# Altium footprint library SparkFun-Retired.PCBLIB: 303 footprints (part 19 of 19)
Each footprint in its own frame and in the unit in brackets; x right, y up, seen from the top. Pads: shape width x height; smd on the part's side, far side on the other; paste and mask are expansions set on the pad; w line width, h text height; cw(c..) or ccw(c..) is an arc to the next point about the centre after c.
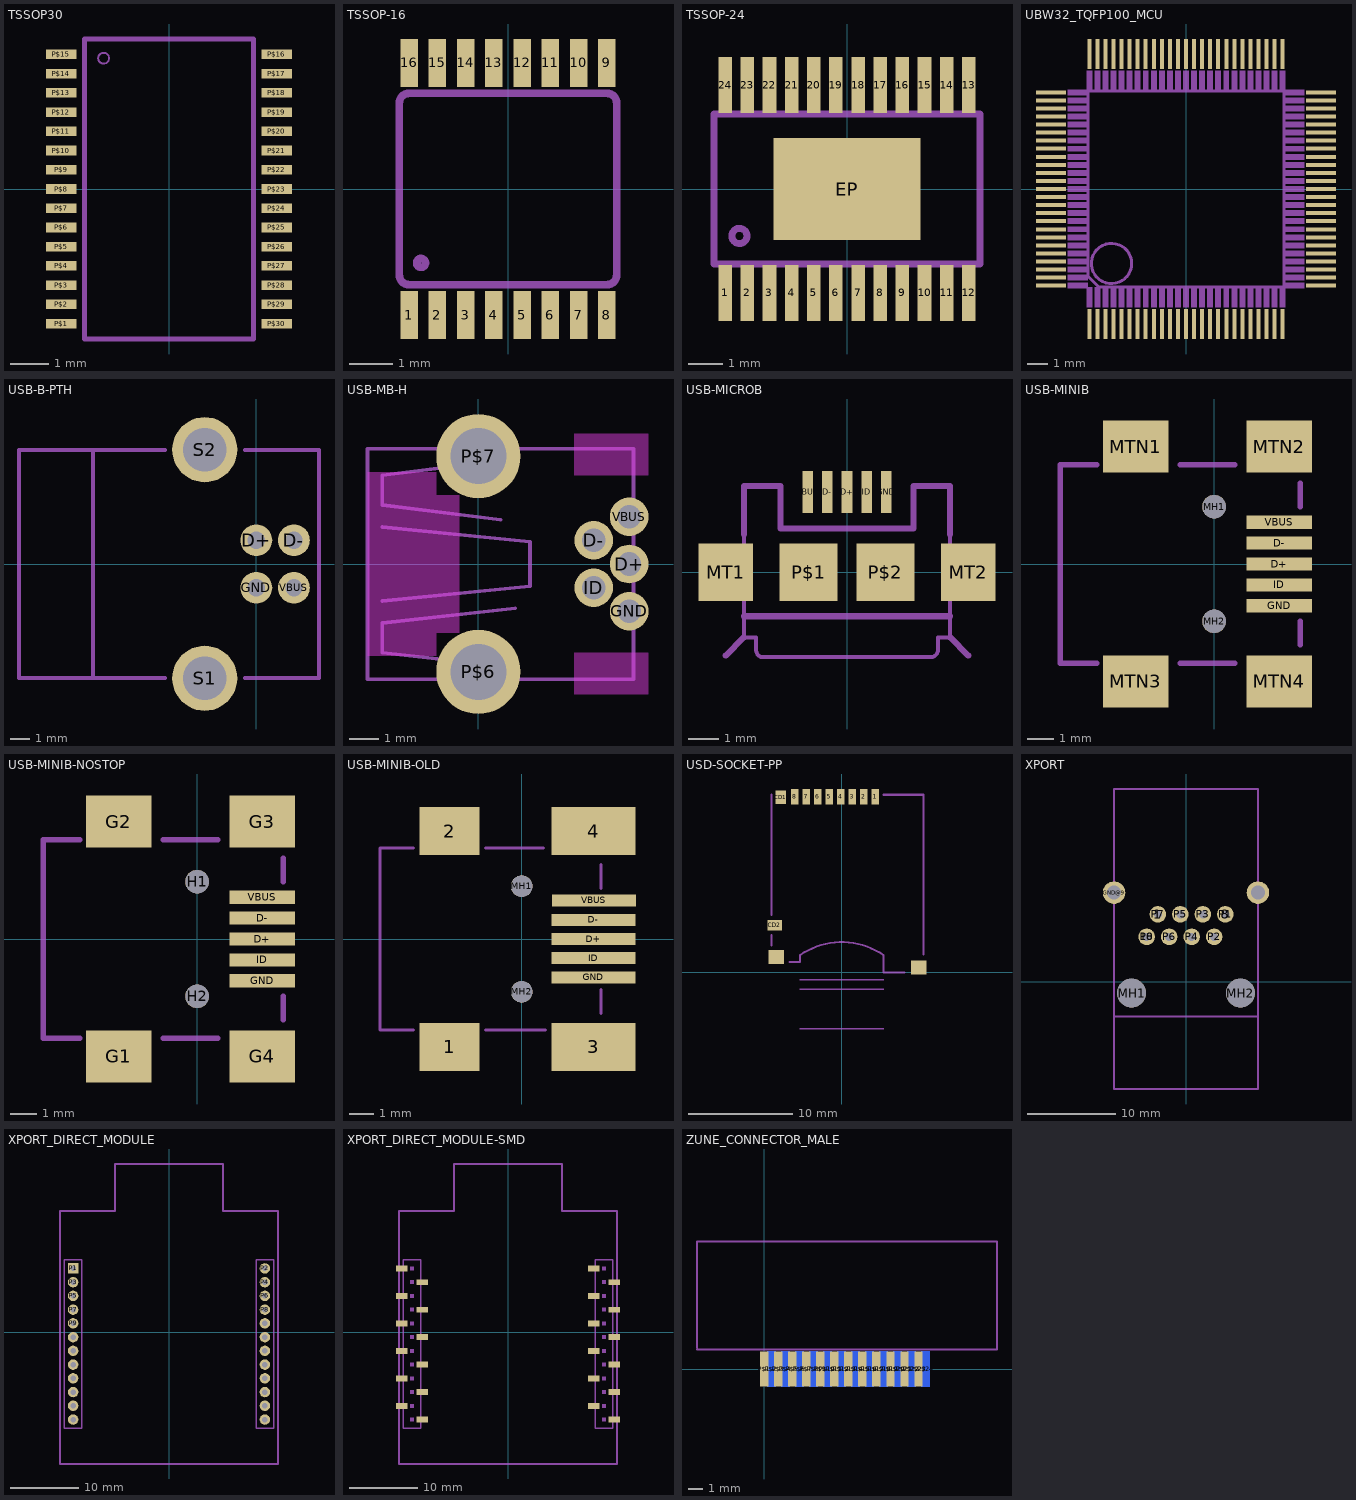
[diagram p18: the footprints below, top view; thin cyan lines are the x and y axes]

## TSSOP30 [mil]
pads (30):
  rect 31.5x9.84 smd: P$1(-110.24,-137.8) P$2(-110.24,-118.11) P$3(-110.24,-98.43) P$4(-110.24,-78.74) P$5(-110.24,-59.06) P$6(-110.24,-39.37) P$7(-110.24,-19.69) P$8(-110.24,0) P$9(-110.24,19.69) P$10(-110.24,39.37) P$11(-110.24,59.06) P$12(-110.24,78.74) P$13(-110.24,98.43) P$14(-110.24,118.11) P$15(-110.24,137.8) P$16(110.24,137.8) P$17(110.24,118.11) P$18(110.24,98.43) P$19(110.24,78.74) P$20(110.24,59.06) P$21(110.24,39.37) P$22(110.24,19.69) P$23(110.24,0) P$24(110.24,-19.69) P$25(110.24,-39.37) P$26(110.24,-59.06) P$27(110.24,-78.74) P$28(110.24,-98.43) P$29(110.24,-118.11) P$30(110.24,-137.8)
tDocu:
  lines w5: -86.61,-153.54 86.61,-153.54 86.61,153.54 -86.61,153.54 -86.61,-153.54
tPlace:
  circle w1.97: c-66.93,133.86 r5.57
  lines w5: -86.61,-153.54 86.61,-153.54 86.61,153.54 -86.61,153.54 -86.61,-153.54

## TSSOP-16 [mil]
pads (16):
  rect 15.75x43.31 smd: 1(-89.57,-114.17) 2(-63.98,-114.17) 3(-38.39,-114.17) 4(-12.8,-114.17) 5(12.8,-114.17) 6(38.39,-114.17) 7(63.98,-114.17) 8(89.57,-114.17) 9(89.57,114.17) 10(63.98,114.17) 11(38.39,114.17) 12(12.8,114.17) 13(-12.8,114.17) 14(-38.39,114.17) 15(-63.98,114.17) 16(-89.57,114.17)
tDocu:
  region: 6.89,-125.98 6.89,-102.36 18.7,-102.36 18.7,-125.98
  region: -18.7,-125.98 -18.7,-102.36 -6.89,-102.36 -6.89,-125.98
  region: -44.29,-125.98 -44.29,-102.36 -32.48,-102.36 -32.48,-125.98
  region: -69.88,-125.98 -69.88,-102.36 -58.07,-102.36 -58.07,-125.98
  region: 32.48,-125.98 32.48,-102.36 44.29,-102.36 44.29,-125.98
  region: 58.07,-125.98 58.07,-102.36 69.88,-102.36 69.88,-125.98
  region: 83.66,-125.98 83.66,-102.36 95.47,-102.36 95.47,-125.98
  region: -95.47,-125.98 -95.47,-102.36 -83.66,-102.36 -83.66,-125.98
  region: -6.89,125.98 -6.89,102.36 -18.7,102.36 -18.7,125.98
  region: 18.7,125.98 18.7,102.36 6.89,102.36 6.89,125.98
  region: 44.29,125.98 44.29,102.36 32.48,102.36 32.48,125.98
  region: 69.88,125.98 69.88,102.36 58.07,102.36 58.07,125.98
  region: -32.48,125.98 -32.48,102.36 -44.29,102.36 -44.29,125.98
  region: -58.07,125.98 -58.07,102.36 -69.88,102.36 -69.88,125.98
  region: -83.66,125.98 -83.66,102.36 -95.47,102.36 -95.47,125.98
  region: 95.47,125.98 95.47,102.36 83.66,102.36 83.66,125.98
tPlace:
  circle w7: c-78.74,-66.93 r3.94
  lines w7: -98.43,-77.81 ccw(c-89.62,-77.81) -89.62,-86.61 89.62,-86.61 ccw(c89.62,-77.81) 98.43,-77.81 98.43,77.81 ccw(c89.62,77.81) 89.62,86.61 -89.62,86.61 ccw(c-89.62,77.81) -98.43,77.81 -98.43,-77.81

## TSSOP-24 [mm]
pads (25):
  rect 0.4x1.65 smd: 1(-3.575,-3.05) 2(-2.925,-3.05) 3(-2.275,-3.05) 4(-1.625,-3.05) 5(-0.975,-3.05) 6(-0.325,-3.05) 7(0.325,-3.05) 8(0.975,-3.05) 9(1.625,-3.05) 10(2.275,-3.05) 11(2.925,-3.05) 12(3.575,-3.05) 13(3.575,3.05) 14(2.925,3.05) 15(2.275,3.05) 16(1.625,3.05) 17(0.975,3.05) 18(0.325,3.05) 19(-0.325,3.05) 20(-0.975,3.05) 21(-1.625,3.05) 22(-2.275,3.05) 23(-2.925,3.05) 24(-3.575,3.05)
  rect 4.32x3 smd: EP(0,0)
tDocu:
  region: 0.2,-3.2 0.2,-2.2 0.45,-2.2 0.45,-3.2
  region: 0.85,-3.2 0.85,-2.2 1.1,-2.2 1.1,-3.2
  region: 1.5,-3.2 1.5,-2.2 1.75,-2.2 1.75,-3.2
  region: 2.15,-3.2 2.15,-2.2 2.4,-2.2 2.4,-3.2
  region: 2.8,-3.2 2.8,-2.2 3.05,-2.2 3.05,-3.2
  region: 3.45,-3.2 3.45,-2.2 3.7,-2.2 3.7,-3.2
  region: -0.45,-3.2 -0.45,-2.2 -0.2,-2.2 -0.2,-3.2
  region: -1.1,-3.2 -1.1,-2.2 -0.85,-2.2 -0.85,-3.2
  region: -1.75,-3.2 -1.75,-2.2 -1.5,-2.2 -1.5,-3.2
  region: -2.4,-3.2 -2.4,-2.2 -2.15,-2.2 -2.15,-3.2
  region: -3.05,-3.2 -3.05,-2.2 -2.8,-2.2 -2.8,-3.2
  region: -3.7,-3.2 -3.7,-2.2 -3.45,-2.2 -3.45,-3.2
  region: 0.2,2.2 0.2,3.2 0.45,3.2 0.45,2.2
  region: 0.85,2.2 0.85,3.2 1.1,3.2 1.1,2.2
  region: 1.5,2.2 1.5,3.2 1.75,3.2 1.75,2.2
  region: 2.15,2.2 2.15,3.2 2.4,3.2 2.4,2.2
  region: 2.8,2.2 2.8,3.2 3.05,3.2 3.05,2.2
  region: 3.45,2.2 3.45,3.2 3.7,3.2 3.7,2.2
  region: -0.45,2.2 -0.45,3.2 -0.2,3.2 -0.2,2.2
  region: -1.1,2.2 -1.1,3.2 -0.85,3.2 -0.85,2.2
  region: -1.75,2.2 -1.75,3.2 -1.5,3.2 -1.5,2.2
  region: -2.4,2.2 -2.4,3.2 -2.15,3.2 -2.15,2.2
  region: -3.05,2.2 -3.05,3.2 -2.8,3.2 -2.8,2.2
  region: -3.7,2.2 -3.7,3.2 -3.45,3.2 -3.45,2.2
  lines w0.203: -3.9,-2.2 3.9,-2.2 3.9,2.2 -3.9,2.2 -3.9,-2.2
tPlace:
  circle w0.203: c-3.156,-1.378 r0.223
  lines w0.203: -3.9,-2 -3.9,2 ; 3.9,-2 3.9,2

## UBW32_TQFP100_MCU [mm]
pads (100):
  rect 0.2x1.5 smd paste+0: 1(-4.8,-6.7) 2(-4.4,-6.7) 3(-4,-6.7) 4(-3.6,-6.7) 5(-3.2,-6.7) 6(-2.8,-6.7) 7(-2.4,-6.7) 8(-2,-6.7) 9(-1.6,-6.7) 10(-1.2,-6.7) 11(-0.8,-6.7) 12(-0.4,-6.7) 13(0,-6.7) 14(0.4,-6.7) 15(0.8,-6.7) 16(1.2,-6.7) 17(1.6,-6.7) 18(2,-6.7) 19(2.4,-6.7) 20(2.8,-6.7) 21(3.2,-6.7) 22(3.6,-6.7) 23(4,-6.7) 24(4.4,-6.7) 25(4.8,-6.7) 51(4.8,6.7) 52(4.4,6.7) 53(4,6.7) 54(3.6,6.7) 55(3.2,6.7) 56(2.8,6.7) 57(2.4,6.7) 58(2,6.7) 59(1.6,6.7) 60(1.2,6.7) 61(0.8,6.7) 62(0.4,6.7) 63(0,6.7) 64(-0.4,6.7) 65(-0.8,6.7) 66(-1.2,6.7) 67(-1.6,6.7) 68(-2,6.7) 69(-2.4,6.7) 70(-2.8,6.7) 71(-3.2,6.7) 72(-3.6,6.7) 73(-4,6.7) 74(-4.4,6.7) 75(-4.8,6.7)
  rect 1.5x0.2 smd paste+0: 26(6.7,-4.8) 27(6.7,-4.4) 28(6.7,-4) 29(6.7,-3.6) 30(6.7,-3.2) 31(6.7,-2.8) 32(6.7,-2.4) 33(6.7,-2) 34(6.7,-1.6) 35(6.7,-1.2) 36(6.7,-0.8) 37(6.7,-0.4) 38(6.7,0) 39(6.7,0.4) 40(6.7,0.8) 41(6.7,1.2) 42(6.7,1.6) 43(6.7,2) 44(6.7,2.4) 45(6.7,2.8) 46(6.7,3.2) 47(6.7,3.6) 48(6.7,4) 49(6.7,4.4) 50(6.7,4.8) 76(-6.7,4.8) 77(-6.7,4.4) 78(-6.7,4) 79(-6.7,3.6) 80(-6.7,3.2) 81(-6.7,2.8) 82(-6.7,2.4) 83(-6.7,2) 84(-6.7,1.6) 85(-6.7,1.2) 86(-6.7,0.8) 87(-6.7,0.4) 88(-6.7,0) 89(-6.7,-0.4) 90(-6.7,-0.8) 91(-6.7,-1.2) 92(-6.7,-1.6) 93(-6.7,-2) 94(-6.7,-2.4) 95(-6.7,-2.8) 96(-6.7,-3.2) 97(-6.7,-3.6) 98(-6.7,-4) 99(-6.7,-4.4) 100(-6.7,-4.8)
Top Paste:
  drawing of 100 lines, arcs and shapes, not listed
tDocu:
  drawing of 100 lines, arcs and shapes, not listed
tPlace:
  circle w0.152: c-3.7,-3.7 r1
  lines w0.152: -4.873,-4.323 -4.323,-4.873 4.873,-4.873 4.873,4.873 -4.873,4.873 -4.873,-4.323

## USB-B-PTH [mil]
pads (6):
  round 66 hole 36: D+(0,49.21) D-(78,49.21) GND(0,-49.21) VBUS(78,-49.21)
  round 135 hole 90: S1(-107,-237) S2(-107,237)
tDocu:
  lines w8: -492.13,-236.22 -338.58,-236.22 -338.58,236.22 -492.13,236.22 -492.13,-236.22
tPlace:
  lines w8: -338.58,-236.22 -188.98,-236.22 ; -338.58,236.22 -188.98,236.22 ; -23.62,-236.22 129.92,-236.22 129.92,236.22 -23.62,236.22

## USB-MB-H [mil]
pads (7):
  round 51.5 hole 31.5: D+(200.79,0) D-(153.54,31.5) GND(200.79,-62.99) ID(153.54,-31.5) VBUS(200.79,62.99)
  round 112.2 hole 74.8: P$6(0,-143.7) P$7(0,143.7)
Top keep-out:
  region: 127.95,118.11 127.95,173.23 226.38,173.23 226.38,118.11
  region: 127.95,-173.23 127.95,-118.11 226.38,-118.11 226.38,-173.23
  region: -147.64,-122.05 -147.64,122.05 -56.1,122.05 -56.1,-122.05
  region: -56.1,-91.54 -56.1,91.54 -25.59,91.54 -25.59,-91.54
bPlace:
  lines w5: -127.95,-49.21 68.9,-29.53 68.9,29.53 -127.95,49.21 ; 29.53,59.06 -127.95,78.74 -127.95,118.11 29.53,137.8 ; 49.21,-137.8 -127.95,-118.11 -127.95,-78.74 49.21,-59.06 ; -147.64,-153.54 -147.64,153.54 206.69,153.54 206.69,-153.54 -147.64,-153.54

## USB-MICROB [mm]
pads (9):
  rect 0.35x1.4 smd: D+(0,2.65) D-(-0.65,2.65) GND(1.3,2.65) ID(0.65,2.65) VBUS(-1.3,2.65)
  rect 1.8x1.9 smd: MT1(-4,0) MT2(4,0)
  rect 1.9x1.9 smd: P$1(-1.27,0) P$2(1.27,0)
tDocu:
  lines w0.127: -3.4,-1.45 -3.4,-2.15 -3,-2.15 -3,-2.55 ccw(c-2.762,-2.565) -2.8,-2.8 2.75,-2.8 ccw(c2.765,-2.563) 3,-2.6 3,-2.15 3.4,-2.15 3.4,-1.45 ; -3.4,-1.45 -3.4,2.85 -2.2,2.85 -2.2,1.45 2.2,1.45 2.2,2.85 3.4,2.85 3.4,-1.45 ; -3.4,-1.45 3.4,-1.45
  lines w0.203: -4,-2.75 -3.4,-2.15 ; 3.4,-2.15 4,-2.75
tPlace:
  lines w0.203: -3.4,-1.45 3.4,-1.45 ; -3.4,1.25 -3.4,2.85 -2.2,2.85 -2.2,1.45 2.2,1.45 2.2,2.85 3.4,2.85 3.4,1.25

## USB-MINIB [mm]
pads (11):
  rect 2.5x0.5 smd: D+(2.5,0) D-(2.5,0.8) GND(2.5,-1.6) ID(2.5,-0.8) VBUS(2.5,1.6)
  round 0.9 hole 0.9 unplated: MH1(0,2.2) MH2(0,-2.2)
  rect 2.5x2 smd: MTN1(-3,4.5) MTN2(2.5,4.5) MTN3(-3,-4.5) MTN4(2.5,-4.5)
tDocu:
  lines w0.203: -4.5,-3.8 -5.9,-3.8 -5.9,3.8 -4.5,3.8
tPlace:
  lines w0.203: -1.3,-3.8 0.8,-3.8 ; -1.3,3.8 0.8,3.8 ; 3.3,-3.1 3.3,-2.2 ; 3.3,2.2 3.3,3.1

## USB-MINIB-NOSTOP [mm]
pads (11):
  rect 2.5x0.5 smd: D+(2.5,0) D-(2.5,0.8) GND(2.5,-1.6) ID(2.5,-0.8) VBUS(2.5,1.6)
  rect 2.5x2 smd: G1(-3,-4.5) G2(-3,4.5) G3(2.5,4.5) G4(2.5,-4.5)
  round 0.9 hole 0.9: H1(0,2.2) H2(0,-2.2)
Top Solder:
  circle w0.41: c0,2.2 r0.35
  circle w0.41: c0,-2.2 r0.35
tDocu:
  lines w0.203: -4.5,-3.8 -5.9,-3.8 -5.9,3.8 -4.5,3.8
tPlace:
  lines w0.203: -1.3,-3.8 0.8,-3.8 ; -1.3,3.8 0.8,3.8 ; 3.3,-3.1 3.3,-2.2 ; 3.3,2.2 3.3,3.1

## USB-MINIB-OLD [mm]
pads (11):
  rect 2.5x2 smd: 1(-3,-4.5) 2(-3,4.5)
  rect 3.5x2 smd: 3(3,-4.5) 4(3,4.5)
  rect 3.5x0.5 smd: D+(3,0) D-(3,0.8) GND(3,-1.6) ID(3,-0.8) VBUS(3.01,1.61)
  round 0.9 hole 0.9 unplated: MH1(0,2.2) MH2(0,-2.2)
tDocu:
  lines w0.127: -4.5,-3.8 -5.9,-3.8 -5.9,3.8 -4.5,3.8
tPlace:
  lines w0.127: -1.5,-3.8 1,-3.8 ; -1.5,3.8 0.9,3.8 ; 3.3,-3.1 3.3,-2.1 ; 3.3,2.1 3.3,3.1

## USD-SOCKET-PP [mm]
pads (12):
  rect 0.75x1.5 smd: 1(3.2,16.8) 2(2.1,16.8) 3(1,16.8) 4(-0.1,16.8) 5(-1.2,16.8) 6(-2.3,16.8) 7(-3.4,16.8) 8(-4.5,16.8)
  rect 1x1.3 smd: CD1(-5.85,16.75)
  rect 1.4x1 smd: CD2(-6.425,4.5)
  rect 1.5x1.35 smd: GND1(-6.275,1.475) GND2(7.375,0.475)
tDocu:
  lines w0.127: -4,-5.4 4,-5.4 ; -4,-1.6 4,-1.6 ; -4,-0.7 4,-0.7
tPlace:
  lines w0.203: -6.725,2.6 -6.725,3.6 ; -6.725,5.5 -6.725,17 ; -5,1 -4,1 -4,1.65 cw(c0,-4.125) 4,1.65 4,0 6,0 ; 4,17 7.825,17 7.825,1.7

## XPORT [mil]
pads (15):
  round 74 hole 35: 1(-125,300) 8(175,300) 10(-175,200) P1(175,300) P2(125,200) P3(75,300) P4(25,200) P5(-25,300) P6(-75,200) P7(-125,300) P8(-175,200)
  round 100 hole 62.99: GND@9(-320,396.89) GND@10(320,396.89)
  round 128 hole 128 unplated: MH1(-242,-50) MH2(242,-50)
tDocu:
  lines w8: -320,-155 -320,-477 320,-477 320,-155
tPlace:
  lines w8: -320,-155 -320,858 320,858 320,-155 -320,-155

## XPORT_DIRECT_MODULE [mil]
pads (24):
  rect 60x60 / inner round 55.43 / far side rect 60x60 hole 31.5: P1(-550,366.14)
  round 60 hole 31.5: P2(550,366.14) P3(-550,287.4) P4(550,287.4) P5(-550,208.66) P6(550,208.66) P7(-550,129.92) P8(550,129.92) P9(-550,51.18) P10(550,51.18) P11(-550,-27.56) P12(550,-27.56) P13(-550,-106.3) P14(550,-106.3) P15(-550,-185.04) P16(550,-185.04) P17(-550,-263.78) P18(550,-263.78) P19(-550,-342.52) P20(550,-342.52) P21(-550,-421.26) P22(550,-421.26) P23(-550,-500) P24(550,-500)
tDocu:
  region: -540,-352.52 -560,-352.52 -560,-332.52 -540,-332.52
  region: -540,-431.26 -560,-431.26 -560,-411.26 -540,-411.26
  region: -540,-510 -560,-510 -560,-490 -540,-490
  region: -540,-273.78 -560,-273.78 -560,-253.78 -540,-253.78
  region: -540,-195.04 -560,-195.04 -560,-175.04 -540,-175.04
  region: -540,-116.3 -560,-116.3 -560,-96.3 -540,-96.3
  region: -540,-37.56 -560,-37.56 -560,-17.56 -540,-17.56
  region: -540,41.18 -560,41.18 -560,61.18 -540,61.18
  region: -540,119.92 -560,119.92 -560,139.92 -540,139.92
  region: -540,198.66 -560,198.66 -560,218.66 -540,218.66
  region: -540,277.4 -560,277.4 -560,297.4 -540,297.4
  region: -540,356.14 -560,356.14 -560,376.14 -540,376.14
  region: 560,-352.52 540,-352.52 540,-332.52 560,-332.52
  region: 560,-431.26 540,-431.26 540,-411.26 560,-411.26
  region: 560,-510 540,-510 540,-490 560,-490
  region: 560,-273.78 540,-273.78 540,-253.78 560,-253.78
  region: 560,-195.04 540,-195.04 540,-175.04 560,-175.04
  region: 560,-116.3 540,-116.3 540,-96.3 560,-96.3
  region: 560,-37.56 540,-37.56 540,-17.56 560,-17.56
  region: 560,41.18 540,41.18 540,61.18 560,61.18
  region: 560,119.92 540,119.92 540,139.92 560,139.92
  region: 560,198.66 540,198.66 540,218.66 560,218.66
  region: 560,277.4 540,277.4 540,297.4 560,297.4
  region: 560,356.14 540,356.14 540,376.14 560,376.14
  lines w10: -625,-755 625,-755 625,695 310,695 310,965 -310,965 -310,695 -625,695 -625,-755
tPlace:
  lines w8: -599.21,-549.21 -599.21,415.35 -500.79,415.35 -500.79,-549.21 -599.21,-549.21 ; 500.79,-549.21 500.79,415.35 599.21,415.35 599.21,-549.21 500.79,-549.21
  lines w10: -625,450 -625,-755 -600,-755 ; 600,-755 625,-755 625,450

## XPORT_DIRECT_MODULE-SMD [mil]
pads (24):
  rect 66.93x33.46 smd: P1(-609.13,365.9) P2(490.87,365.9) P3(-491.02,287.16) P4(608.98,287.16) P5(-609.13,208.4) P6(490.87,208.4) P7(-491.02,129.68) P8(608.98,129.68) P9(-609.13,50.92) P10(490.87,50.92) P11(-491.02,-27.82) P12(608.98,-27.82) P13(-609.13,-106.56) P14(490.87,-106.56) P15(-491.02,-185.3) P16(608.98,-185.3) P17(-609.13,-264.04) P18(490.87,-264.04) P19(-491.02,-342.78) P20(608.98,-342.78) P21(-609.13,-421.52) P22(490.87,-421.52) P23(-491.02,-500.26) P24(608.98,-500.26)
tDocu:
  region: -540,-352.52 -560,-352.52 -560,-332.52 -540,-332.52
  region: -540,-431.26 -560,-431.26 -560,-411.26 -540,-411.26
  region: -540,-510 -560,-510 -560,-490 -540,-490
  region: -540,-273.78 -560,-273.78 -560,-253.78 -540,-253.78
  region: -540,-195.04 -560,-195.04 -560,-175.04 -540,-175.04
  region: -540,-116.3 -560,-116.3 -560,-96.3 -540,-96.3
  region: -540,-37.56 -560,-37.56 -560,-17.56 -540,-17.56
  region: -540,41.18 -560,41.18 -560,61.18 -540,61.18
  region: -540,119.92 -560,119.92 -560,139.92 -540,139.92
  region: -540,198.66 -560,198.66 -560,218.66 -540,218.66
  region: -540,277.4 -560,277.4 -560,297.4 -540,297.4
  region: -540,356.14 -560,356.14 -560,376.14 -540,376.14
  region: 560,-352.52 540,-352.52 540,-332.52 560,-332.52
  region: 560,-431.26 540,-431.26 540,-411.26 560,-411.26
  region: 560,-510 540,-510 540,-490 560,-490
  region: 560,-273.78 540,-273.78 540,-253.78 560,-253.78
  region: 560,-195.04 540,-195.04 540,-175.04 560,-175.04
  region: 560,-116.3 540,-116.3 540,-96.3 560,-96.3
  region: 560,-37.56 540,-37.56 540,-17.56 560,-17.56
  region: 560,41.18 540,41.18 540,61.18 560,61.18
  region: 560,119.92 540,119.92 540,139.92 560,139.92
  region: 560,198.66 540,198.66 540,218.66 560,218.66
  region: 560,277.4 540,277.4 540,297.4 560,297.4
  region: 560,356.14 540,356.14 540,376.14 560,376.14
  lines w8: -599.28,-391.97 -599.28,415.11 -500.86,415.11 -500.86,-391.97 ; -599.28,257.61 -599.28,-549.47 -500.86,-549.47 -500.86,257.61 ; 500.72,-391.97 500.72,415.11 599.14,415.11 599.14,-391.97 ; 500.72,257.61 500.72,-549.47 599.14,-549.47 599.14,257.61
  lines w10: -625,-755 625,-755 625,695 310,695 310,965 -310,965 -310,695 -625,695 -625,-755
tPlace:
  lines w8: -599.28,-527.82 -599.28,-549.47 -500.86,-549.47 -500.86,-527.82 ; -599.28,389.52 -599.28,415.11 -500.86,415.11 -500.86,389.52 ; 500.72,-527.82 500.72,-549.47 599.14,-549.47 599.14,-527.82 ; 500.72,389.52 500.72,415.11 599.14,415.11 599.14,389.52 ; -599.21,-549.21 -599.21,415.35 -500.79,415.35 -500.79,-549.21 -599.21,-549.21 ; 500.79,-549.21 500.79,415.35 599.21,415.35 599.21,-549.21 500.79,-549.21
  lines w10: -625,450 -625,-755 -600,-755 ; 600,-755 625,-755 625,450

## ZUNE_CONNECTOR_MALE [mm]
pads (24):
  rect 0.6x2.5 smd: P$1(0,0) P$3(1,0) P$5(2,0) P$7(3,0) P$9(4,0) P$11(5,0) P$13(6,0) P$15(7,0) P$17(8,0) P$19(9,0) P$21(10,0) P$23(11,0)
  rect 0.6x2.5 smd far side: P$2(0.5,0) P$4(1.5,0) P$6(2.5,0) P$8(3.5,0) P$10(4.5,0) P$12(5.5,0) P$14(6.5,0) P$16(7.5,0) P$18(8.5,0) P$20(9.5,0) P$22(10.5,0) P$24(11.5,0)
tDocu:
  lines w0.127: -4.8,1.4 16.6,1.4 16.6,9.1 -4.8,9.1 -4.8,1.5
  text "Connector should be used only with 1.2mm PCB thickness." at -0.9,1.8 h0.47